# Altium footprint library Hydra_Ref_pcb.PcbLib: 353 footprints (part 22 of 23)
Each footprint in its own frame and in the unit in brackets; x right, y up, seen from the top. Pads: shape width x height; smd on the part's side, far side on the other; paste and mask are expansions set on the pad; w line width, h text height; cw(c..) or ccw(c..) is an arc to the next point about the centre after c.
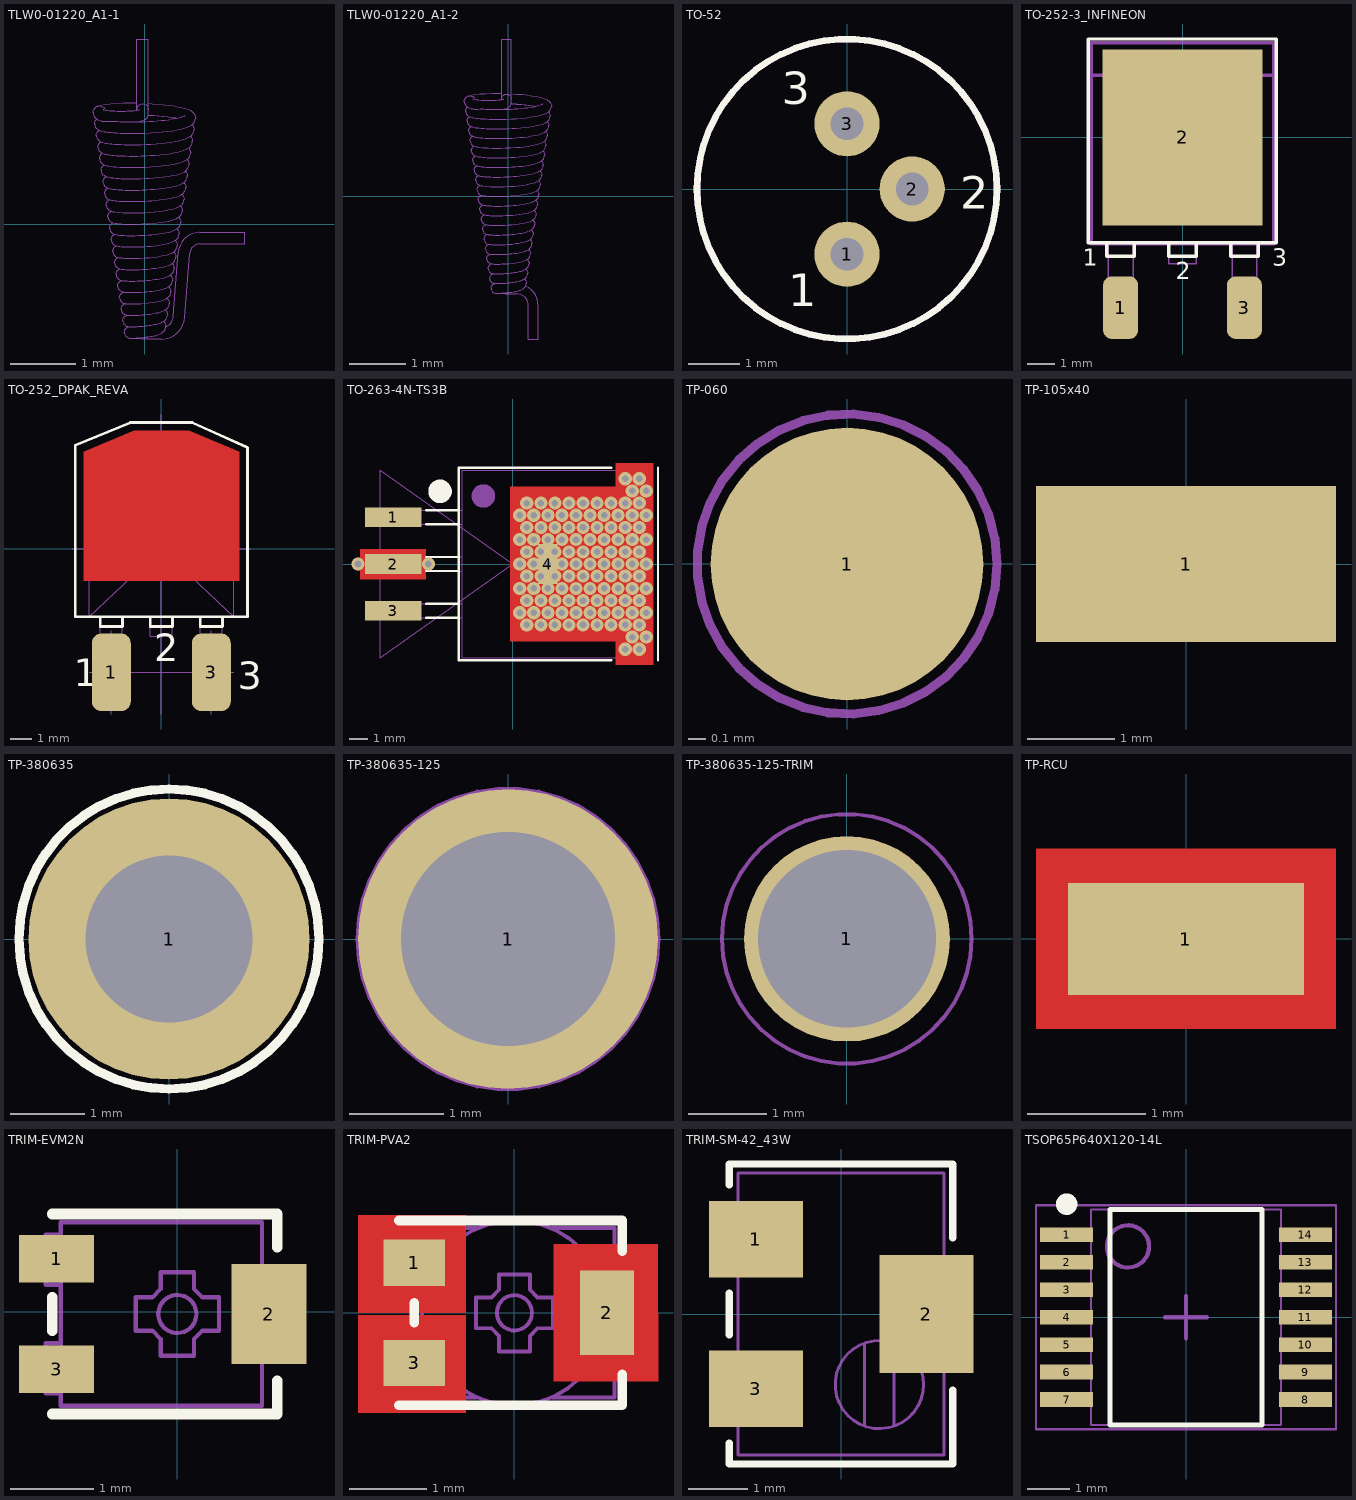
[diagram p21: the footprints below, top view; thin cyan lines are the x and y axes]

## TLW0-01220_A1-1 [mil]
9 Top Assy:
  drawing of 1006 lines, arcs and shapes, not listed
  text ".Designator" at 34.45,80.71 h25
3D body: height 61.17, standoff 1.23, extent -30.92,-68.84 60.01,110.79

## TLW0-01220_A1-2 [mil]
9 Top Assy:
  drawing of 981 lines, arcs and shapes, not listed
  text ".Designator" at -23.62,-72.83 h25
3D body: height 61.12, standoff 1.23, extent -30.92,-100.59 30.42,110.79

## TO-52 [mil]
height 150
pads (3):
  round 50 hole 25: 1(0,-50) 2(50,0) 3(0,50)
Top Overlay:
  circle w5: c0,0 r115
  text "2" at 87,-15 h25
  text "1" at -45,-90 h25
  text "3" at -50,65 h25
9 Top Assy:
  circle w5: c0,0 r115
  text ".Designator" at 65,-65 h25
  text "1" at -40,-85 h20
  text "2" at 82,-10 h20
  text "3" at -50,65 h20
3D body: height 30, standoff 0, extent -114.09,-114.77 115,114.78
3D body: height 180, standoff 30, extent -96.72,-97.3 97.51,97.31
3D body: height 30, standoff 0, extent -114.09,-114.77 115.01,114.77

## TO-252-3_INFINEON [mil]
height 0.19
pads (3):
  rrect50% 51x91 smd: 1(-90,-247.5) 3(90,-247.5)
  rect 232x256 smd: 2(0,0)
Top Overlay:
  lines w5: -110,-155.5 -110,-173 -70,-173 -70,-155.5 ; -20,-155.5 -20,-173 20,-173 20,-155.5 ; 70,-155.5 70,-173 110,-173 110,-155.5 ; -137,-153 -137,143 136,143 136,-153 -137,-153
  text "3" at 130,-186.5 h25
  text "1" at -145,-186.5 h25
  text "2" at -10,-206.5 h25
9 Top Assy:
  lines w2: -108,-225 -72,-225 ; -108,-154.75 -108,-275.25 -72,-275.25 -72,-154.75 ; -20,-154.75 -20,-183.75 20,-183.75 20,-154.75 ; 72,-225 108,-225 ; 72,-154.75 72,-275.25 108,-275.25 108,-154.75
  lines w5: -132.5,90.25 132.5,90.25 ; -132.5,90.25 -132.5,-154.75 132.5,-154.75 132.5,90.25 ; -132.5,90.25 -132.5,137.75 132.5,137.75 132.5,90.25
  text "3" at 82.5,-201.25 h20
  text "2" at -5,-212.25 h20
  text "1" at -92.5,-201.25 h20
  text ".Designator" at -60,-42.25 h30
3D body: height 40, standoff 0, extent -132.5,90.25 132.5,137.75
3D body: height 95, standoff 0, extent -132.5,-154.75 132.5,90.25

## TO-252_DPAK_REVA [mil]
height 94
pads (3):
  rrect50% 70x140 smd: 1(-90,-222.5) 3(90,-222.5)
  round 0 smd paste-1000 mask-1000: 2(0,77.5)
Top Layer:
  region: -140,-57.5 140,-57.5 140,175 50,212.5 -50,212.5 -140,175
Top Overlay:
  lines w5: -110,-122.5 -110,-140 -70,-140 -70,-122.5 ; -20,-122.5 -20,-140 20,-140 20,-122.5 ; 70,-122.5 70,-140 110,-140 110,-122.5 ; -155,-122.5 -155,186 -56,227 56,227 155,182.25 155,-122.5 -155,-122.5
  text "2" at -12.5,-202.5 h50
  text "1" at -157.5,-247.5 h50
  text "3" at 137.5,-252.5 h50
Top Paste:
  region: -140,-57.5 140,-57.5 140,175 50,212.5 -50,212.5 -140,175
Top Solder:
  region: 50.8,216.5 51.67,216.5 141.67,179 142.27,178.39 143.06,178.06 143.39,177.26 144,176.65 144,175.79 144.33,175 144.33,-57.5 143.06,-60.56 140,-61.83 -140,-61.83 -143.06,-60.56 -144.33,-57.5 -144.33,175 -144,175.79 -144,176.65 -143.39,177.26 -143.06,178.06 -142.27,178.39 -141.67,179 -51.67,216.5 -50.8,216.5 -50,216.83 50,216.83
9 Top Assy:
  lines w2: -110,-172.5 -70,-172.5 ; -110,-122.5 -110,-232.5 ; -100,-22.5 -100,-37.5 -75,-37.5 ; -100,2.5 -100,27.5 ; -100,52.5 -100,77.5 ; -100,105 -100,122.5 -100,142.5 -50,162.5 50,162.5 100,142.5 100,122.5 100,105 ; -70,-122.5 -70,-232.5 ; -50,-37.5 -25,-37.5 ; -20,-125 -20,-157.5 20,-157.5 20,-122.5 ; 0,-37.5 25,-37.5 ; 50,-40 75,-40 ; 70,-172.5 110,-172.5 ; 70,-122.5 70,-232.5 ; 87.5,-40 100,-40 100,-12.5 ; 100,10 100,40 ; 100,60 100,80 ; 110,-122.5 110,-232.5 ; -110,-232.5 -70,-232.5 ; -110,-232.5 -70,-212.5 -110,-212.5 -70,-232.5 ; 70,-232.5 110,-232.5 ; 70,-232.5 110,-212.5 70,-212.5 110,-232.5 ; -130,-122.5 -130,122.5 130,122.5 130,-122.5 -130,-122.5
  text ".Designator" at -62.5,-105 h30
  text "1" at -92.5,-157.5 h20
  text "2" at -7.5,-147.5 h20
  text "3" at 82.5,-157.5 h20
13 Top 3D Bodies:
  lines w1: -160,0 160,0 ; -130,-222.5 130,-222.5 ; -110,-172.5 -70,-172.5 ; -110,-122.5 -110,-232.5 ; -100,-22.5 -100,-37.5 -75,-37.5 ; -100,2.5 -100,27.5 ; -100,52.5 -100,77.5 ; -100,102.5 -100,122.5 -100,142.5 -50,162.5 50,162.5 100,142.5 100,122.5 100,102.5 ; -90,-297.5 -90,-147.5 ; -70,-122.5 -70,-232.5 ; -50,-37.5 -25,-37.5 ; -20,-122.5 -20,-157.5 20,-157.5 20,-122.5 ; 0,-297.5 0,242.5 ; 0,-37.5 25,-37.5 ; 50,-40 75,-40 ; 70,-172.5 110,-172.5 ; 70,-122.5 70,-232.5 ; 87.5,-40 100,-40 100,-12.5 ; 90,-297.5 90,-147.5 ; 100,10 100,40 ; 100,65 100,85 ; 110,-122.5 110,-232.5 ; -130,-122.5 -130,122.5 ; -130,-122.5 130,122.5 ; -130,-122.5 130,-122.5 ; -130,122.5 130,122.5 ; -130,122.5 130,-122.5 ; -110,-232.5 -70,-232.5 ; -110,-232.5 -70,-212.5 -110,-212.5 -70,-232.5 ; 70,-232.5 110,-232.5 ; 70,-232.5 110,-212.5 70,-212.5 110,-232.5 ; 130,-122.5 130,122.5
3D body: height 94, standoff 0, extent -100,-42.5 100,160

## TO-263-4N-TS3B [mil] "3-lead TO-263, NS Package TS3B"
height 190
pads (4):
  rect 120x42 smd: 1(-255,100) 2(-255,0) 3(-255,-100)
  rect 42x85 smd: 4(75,0)
via -330,0 diameter 28 hole 14
via -180,0 diameter 28 hole 14
via 270,-181.87 diameter 28 hole 14
via 240,-181.87 diameter 28 hole 14
via 270,181.87 diameter 28 hole 14
via 240,181.87 diameter 28 hole 14
via 255,155.88 diameter 28 hole 14
via 285,155.88 diameter 28 hole 14
via 30,-129.9 diameter 28 hole 14
via 60,-129.9 diameter 28 hole 14
via 90,-129.9 diameter 28 hole 14
via 120,-129.9 diameter 28 hole 14
via 150,-129.9 diameter 28 hole 14
via 180,-129.9 diameter 28 hole 14
via 210,-129.9 diameter 28 hole 14
via 240,-129.9 diameter 28 hole 14
via 270,-129.9 diameter 28 hole 14
via 255,-155.88 diameter 28 hole 14
via 285,-155.88 diameter 28 hole 14
via 30,-77.94 diameter 28 hole 14
via 60,-77.94 diameter 28 hole 14
via 90,-77.94 diameter 28 hole 14
via 120,-77.94 diameter 28 hole 14
via 150,-77.94 diameter 28 hole 14
via 180,-77.94 diameter 28 hole 14
via 210,-77.94 diameter 28 hole 14
via 240,-77.94 diameter 28 hole 14
via 270,-77.94 diameter 28 hole 14
via 15,-103.92 diameter 28 hole 14
via 45,-103.92 diameter 28 hole 14
via 75,-103.92 diameter 28 hole 14
via 105,-103.92 diameter 28 hole 14
via 135,-103.92 diameter 28 hole 14
via 165,-103.92 diameter 28 hole 14
via 195,-103.92 diameter 28 hole 14
via 225,-103.92 diameter 28 hole 14
via 255,-103.92 diameter 28 hole 14
via 285,-103.92 diameter 28 hole 14
via 30,-25.98 diameter 28 hole 14
via 60,-25.98 diameter 28 hole 14
via 90,-25.98 diameter 28 hole 14
via 120,-25.98 diameter 28 hole 14
via 150,-25.98 diameter 28 hole 14
via 180,-25.98 diameter 28 hole 14
via 210,-25.98 diameter 28 hole 14
via 240,-25.98 diameter 28 hole 14
via 270,-25.98 diameter 28 hole 14
via 15,-51.96 diameter 28 hole 14
via 45,-51.96 diameter 28 hole 14
via 75,-51.96 diameter 28 hole 14
via 105,-51.96 diameter 28 hole 14
via 135,-51.96 diameter 28 hole 14
via 165,-51.96 diameter 28 hole 14
via 195,-51.96 diameter 28 hole 14
via 225,-51.96 diameter 28 hole 14
via 255,-51.96 diameter 28 hole 14
via 285,-51.96 diameter 28 hole 14
via 30,129.9 diameter 28 hole 14
via 60,129.9 diameter 28 hole 14
via 90,129.9 diameter 28 hole 14
via 120,129.9 diameter 28 hole 14
via 150,129.9 diameter 28 hole 14
via 180,129.9 diameter 28 hole 14
via 210,129.9 diameter 28 hole 14
via 240,129.9 diameter 28 hole 14
via 270,129.9 diameter 28 hole 14
via 30,77.94 diameter 28 hole 14
via 60,77.94 diameter 28 hole 14
via 90,77.94 diameter 28 hole 14
via 120,77.94 diameter 28 hole 14
via 150,77.94 diameter 28 hole 14
via 180,77.94 diameter 28 hole 14
via 210,77.94 diameter 28 hole 14
via 240,77.94 diameter 28 hole 14
via 270,77.94 diameter 28 hole 14
via 15,103.92 diameter 28 hole 14
via 45,103.92 diameter 28 hole 14
via 75,103.92 diameter 28 hole 14
via 105,103.92 diameter 28 hole 14
via 135,103.92 diameter 28 hole 14
via 165,103.92 diameter 28 hole 14
via 195,103.92 diameter 28 hole 14
via 225,103.92 diameter 28 hole 14
via 255,103.92 diameter 28 hole 14
via 285,103.92 diameter 28 hole 14
via 285,51.96 diameter 28 hole 14
via 255,51.96 diameter 28 hole 14
via 225,51.96 diameter 28 hole 14
via 195,51.96 diameter 28 hole 14
via 165,51.96 diameter 28 hole 14
via 135,51.96 diameter 28 hole 14
via 105,51.96 diameter 28 hole 14
via 75,51.96 diameter 28 hole 14
via 45,51.96 diameter 28 hole 14
via 15,51.96 diameter 28 hole 14
via 270,25.98 diameter 28 hole 14
via 240,25.98 diameter 28 hole 14
via 210,25.98 diameter 28 hole 14
via 180,25.98 diameter 28 hole 14
via 150,25.98 diameter 28 hole 14
via 120,25.98 diameter 28 hole 14
via 90,25.98 diameter 28 hole 14
via 60,25.98 diameter 28 hole 14
via 30,25.98 diameter 28 hole 14
via 15,0 diameter 28 hole 14
via 45,0 diameter 28 hole 14
via 285,0 diameter 28 hole 14
via 255,0 diameter 28 hole 14
via 225,0 diameter 28 hole 14
via 195,0 diameter 28 hole 14
via 165,0 diameter 28 hole 14
via 135,0 diameter 28 hole 14
via 105,0 diameter 28 hole 14
via 75,0 diameter 28 hole 14
Top Layer:
  region: 300,215 220,215 220,165 -5,165 -5,-165 220,-165 220,-215 300,-215
  pour cut-out: -325,31 -325,-32 -185,-32 -185,31
  lines w28: -330,0 -255,0 -180,0
Top Overlay:
  circle w30: c-155,155 r10
  lines w5: -185,-115 -115,-115 ; -185,-85 -115,-85 ; -185,-15 -115,-15 ; -185,15 -115,15 ; -185,85 -115,85 ; -185,115 -115,115 ; 210,-205 -115,-205 -115,205 210,205 ; 310,-205 310,205
Top Paste:
  region: 300,215 220,215 220,165 -5,165 -5,-165 220,-165 220,-215 300,-215
  region: 300,215 220,215 220,165 -5,165 -5,-165 220,-165 220,-215 300,-215
Top Solder:
  region: 305,220 215,220 215,170 -10,170 -10,-170 215,-170 215,-220 305,-220
9 Top Assy:
  circle w30: c-62.5,145 r10
  lines w2: -202.5,-115 -202.5,-85 ; -202.5,-15 -202.5,15 ; -202.5,85 -202.5,115 ; -107.5,-115 -282.5,-115 -282.5,-85 -107.5,-85 ; -107.5,-15 -282.5,-15 -282.5,15 -107.5,15 ; -107.5,85 -282.5,85 -282.5,115 -107.5,115 ; 222.5,-200 222.5,200 ; 232.5,-200 232.5,200 ; -107.5,-200 -107.5,200 272.5,200 282.5,135 282.5,-135 272.5,-200 -107.5,-200
  text ".Designator" at -77.5,-20 h60
22 Part Dimentions & Info:
  lines w2: -282.5,-200 -282.5,200 282.5,-200 282.5,200 -282.5,-200
3D body: height 190, standoff 0, extent -330,-230 320,230

## TP-060 [mil] ".060\" Test Point"
pads (1):
  round 60 smd: 1(0,0)
9 Top Assy:
  circle w2: c0,0 r33
  text ".Designator" at -27.56,-7.87 h16
3D body: height 37.4, standoff 0.39, extent -47.24,-27.56 47.24,27.56

## TP-105x40 [mil] "SMT TEST POINT, PAD .105\"x.040\""
height 65
pads (1):
  rect 135x70 smd: 1(0,0)
9 Top Assy:
  lines w2: -53,-20 53,-20 53,20 -53,20 -53,-20
  text ".Designator" at -48,-13 h27
3D body: height 65, standoff 0, extent -77.5,-45 77.5,45

## TP-380635 [mil] "AMP SOCKET 89H150P Height on top side 0.035 and 0.220 on oposite side"
height 35
pads (1):
  round 150 hole 89: 1(0,0)
Top Overlay:
  circle w5: c0,0 r80
8 Bott Assy:
  circle w2: c0,0 r43.75
9 Top Assy:
  circle w2: c0,0 r62.5
  text ".Designator" at -14.44,68.37 h32
3D body: height 35, standoff 0, extent -62.48,-62.48 62.48,62.48
3D body: height 0, standoff -219, extent -43.73,-43.73 43.73,43.73

## TP-380635-125 [mil] "AMP SOCKET 89H150P Height on top side 0.035 and 0.220 on opposite side, 125mil pad"
height 35
pads (1):
  round 125 / inner round 103 / far side round 125 hole 89: 1(0,0)
8 Bott Assy:
  circle w2: c0,0 r43.75
9 Top Assy:
  circle w2: c0,0 r62.5
  text ".Designator" at -19.99,69.98 h40
3D body: height 0, standoff -219, extent -43.73,-43.73 43.73,43.73
3D body: height 35, standoff 0, extent -62.48,-62.48 62.48,62.48

## TP-380635-125-TRIM [mil] "AMP SOCKET 89H150P Height on top side 0.035 and 0.220 on opposite side, 150mil chamfered pad"
height 35
pads (1):
  round 103 hole 89: 1(0,0)
8 Bott Assy:
  circle w2: c0,0 r43.75
9 Top Assy:
  circle w2: c0,0 r62.5
  text ".Designator" at -19.99,69.98 h40
Multi-Layer:
  region: -74.94,-3.08 -74.64,-10.39 -71.22,-24.61 -65.13,-37.9 -56.58,-49.77 -45.9,-59.76 -33.49,-67.5 -19.82,-72.7 -5.41,-75.16 9.21,-74.79 23.48,-71.6 36.87,-65.72 48.87,-57.36 59.03,-46.84 66.97,-34.56 72.38,-20.97 75.07,-6.59 74.93,8.03 71.96,22.35 66.29,35.83 58.12,47.96 47.77,58.28 35.61,66.41 22.11,72.04 7.78,74.95 0.47,75
3D body: height 35, standoff 0, extent -62.48,-62.48 62.48,62.48
3D body: height 0, standoff -219, extent -43.73,-43.73 43.73,43.73

## TP-RCU [mm] "0603 size test point -KOA"
height 1.3
pads (1):
  rect 2x0.95 smd: 1(0,0)
Top Layer:
  pour cut-out: -1.27,0.762 -1.27,-0.762 1.27,-0.762 1.27,0.762
9 Top Assy:
  lines w0.051: -0.8,-0.4 -0.8,0.4 0.8,0.4 0.8,-0.4 -0.8,-0.4
  text ".Designator" at -0.7,-0.2 h0.41
3D body: height 0.95, standoff 0.01, extent -1.2,-0.7 1.2,0.7

## TRIM-EVM2N [mm] "TRIMMER LOW PROFILE 2.2X2.81x0.81mm PANASONIC"
height 0.81
pads (3):
  rect 0.9x0.575 smd: 1(-1.45,0.637) 3(-1.45,-0.688)
  rect 0.9x1.2 smd: 2(1.1,-0.025)
Top Overlay:
  lines w0.127: -1.5,-1.225 1.2,-1.225 1.2,-0.825 ; -1.5,-0.225 -1.5,0.175 ; -1.5,1.175 1.2,1.175 1.2,0.775
9 Top Assy:
  circle w0.051: c0,-0.025 r0.229
  lines w0.051: -1.4,-0.975 -1.58,-0.975 -1.58,-0.375 -1.4,-0.375 ; -1.4,0.325 -1.58,0.325 -1.58,0.925 -1.4,0.925 ; 1.016,-0.525 1.23,-0.525 1.23,0.475 1.016,0.475 ; -1.4,-1.125 -1.4,1.075 1.016,1.075 1.016,-1.125 -1.4,-1.125 ; -0.5,-0.225 -0.3,-0.225 -0.2,-0.325 -0.2,-0.525 0.2,-0.525 0.2,-0.325 0.3,-0.225 0.5,-0.225 0.5,0.175 0.3,0.175 0.2,0.275 0.2,0.475 -0.2,0.475 -0.2,0.275 -0.3,0.175 -0.5,0.175 -0.5,-0.225
  text ".Designator" at -0.635,-1.016 h0.56
3D body: height 1, standoff 0.01, extent -2.286,-1.549 1.905,1.499

## TRIM-PVA2 [mm] "TRIMMER LOW PROFILE 2.2X2.75x0.81mm PANASONIC"
height 0.81
pads (3):
  rect 0.8x0.6 smd: 1(-1.3,0.65) 3(-1.3,-0.65)
  rect 0.7x1.1 smd: 2(1.2,0)
Top Layer:
  pour cut-out: 0.508,0.889 0.508,-0.889 1.865,-0.889 1.865,0.889
  pour cut-out: -2.032,-0.03 -2.032,-1.3 -0.635,-1.3 -0.635,-0.03
  pour cut-out: -2.032,1.27 -2.032,0 -0.635,0 -0.635,1.27
Top Overlay:
  lines w0.127: -1.5,-1.2 1.4,-1.2 1.4,-0.8 ; -1.5,1.2 1.4,1.2 1.4,0.8 ; -1.3,-0.127 -1.3,0.127
9 Top Assy:
  circle w0.051: c0,0 r0.229
  circle w0.051: c0,0 r1.2
  lines w0.051: -1.15,-0.35 -1.45,-0.35 -1.45,-0.75 -1.3,-0.75 -1.3,-1.1 -0.5,-1.1 ; -1.15,0.35 -1.45,0.35 -1.45,0.75 -1.3,0.75 -1.3,1.1 -0.5,1.1 ; 0.5,-1.1 1.3,-1.1 1.3,-0.5 1.15,-0.35 ; 0.5,1.1 1.3,1.1 1.3,0.5 1.15,0.35 ; 1.18,-0.3 1.3,-0.3 1.3,0.3 1.18,0.3 ; -0.5,-0.2 -0.3,-0.2 -0.2,-0.3 -0.2,-0.5 0.2,-0.5 0.2,-0.3 0.3,-0.2 0.5,-0.2 0.5,0.2 0.3,0.2 0.2,0.3 0.2,0.5 -0.2,0.5 -0.2,0.3 -0.3,0.2 -0.5,0.2 -0.5,-0.2
  text ".Designator" at -0.559,-0.965 h0.36
3D body: height 1, standoff 0.01, extent -1.3,-1.1 1.3,1.1

## TRIM-SM-42_43W [mm] "TRIMMER 3.9X4.8mm COPAL ELECTRONIC"
height 5.499
pads (3):
  rect 1.6x1.3 smd: 1(-1.45,1.27) 3(-1.45,-1.27)
  rect 1.6x2 smd: 2(1.45,0)
Top Overlay:
  lines w0.127: -1.9,-2.2 -1.9,-2.55 1.9,-2.55 1.9,-1.3 ; -1.9,-0.35 -1.9,0.35 ; -1.9,2.2 -1.9,2.55 1.9,2.55 1.9,1.3
9 Top Assy:
  circle w0.051: c0.65,-1.2 r0.75
  lines w0.051: -1.75,-1.67 -1.95,-1.67 -1.95,-0.87 -1.75,-0.87 ; -1.75,0.87 -1.95,0.87 -1.95,1.67 -1.75,1.67 ; 0.4,-1.9 0.4,-0.5 ; 0.9,-1.9 0.9,-0.5 ; 1.75,-0.65 1.95,-0.65 1.95,0.65 1.75,0.65 ; -1.75,-2.4 -1.75,2.4 1.75,2.4 1.75,-2.4 -1.75,-2.4
  text ".Designator" at -0.381,-2.032 h1.14
3D body: height 5.5, standoff 0.01, extent -2.54,-2.794 2.54,2.794

## TSOP65P640X120-14L [mm] "TSOP, 14-Leads, Body 5.00x4.40mm, Pitch 0.65mm, IPC High Density"
height 1.2
pads (14):
  rect 1.25x0.35 smd: 1(-2.825,1.95) 2(-2.825,1.3) 3(-2.825,0.65) 4(-2.825,0) 5(-2.825,-0.65) 6(-2.825,-1.3) 7(-2.825,-1.95) 8(2.825,-1.95) 9(2.825,-1.3) 10(2.825,-0.65) 11(2.825,0) 12(2.825,0.65) 13(2.825,1.3) 14(2.825,1.95)
Top Overlay:
  circle w0.254: c-2.825,2.675 r0.127
  lines w0.127: -1.8,-2.55 1.8,-2.55 1.8,2.55 -1.8,2.55 -1.8,-2.55
9 Top Assy:
  circle w0.1: c-1.375,1.675 r0.5
  lines w0.051: -2.25,-2.55 2.25,-2.55 2.25,2.55 -2.25,2.55 -2.25,-2.55
  text ".Designator" at 0.254,-2.088 h0.64
15 Top Optical Placement:
  lines w0.051: -3.55,-2.65 3.55,-2.65 3.55,2.65 -3.55,2.65 -3.55,-2.65
  lines w0.1: -0.5,0 0.5,0 ; 0,-0.5 0,0.5
3D body: height 1.2, standoff 0.05, extent -2.25,-2.55 2.25,2.55